# Altium footprint library CONNECTOR.PcbLib: 59 footprints (part 2 of 4)
Each footprint in its own frame and in the unit in brackets; x right, y up, seen from the top. Pads: shape width x height; smd on the part's side, far side on the other; paste and mask are expansions set on the pad; w line width, h text height; cw(c..) or ccw(c..) is an arc to the next point about the centre after c.
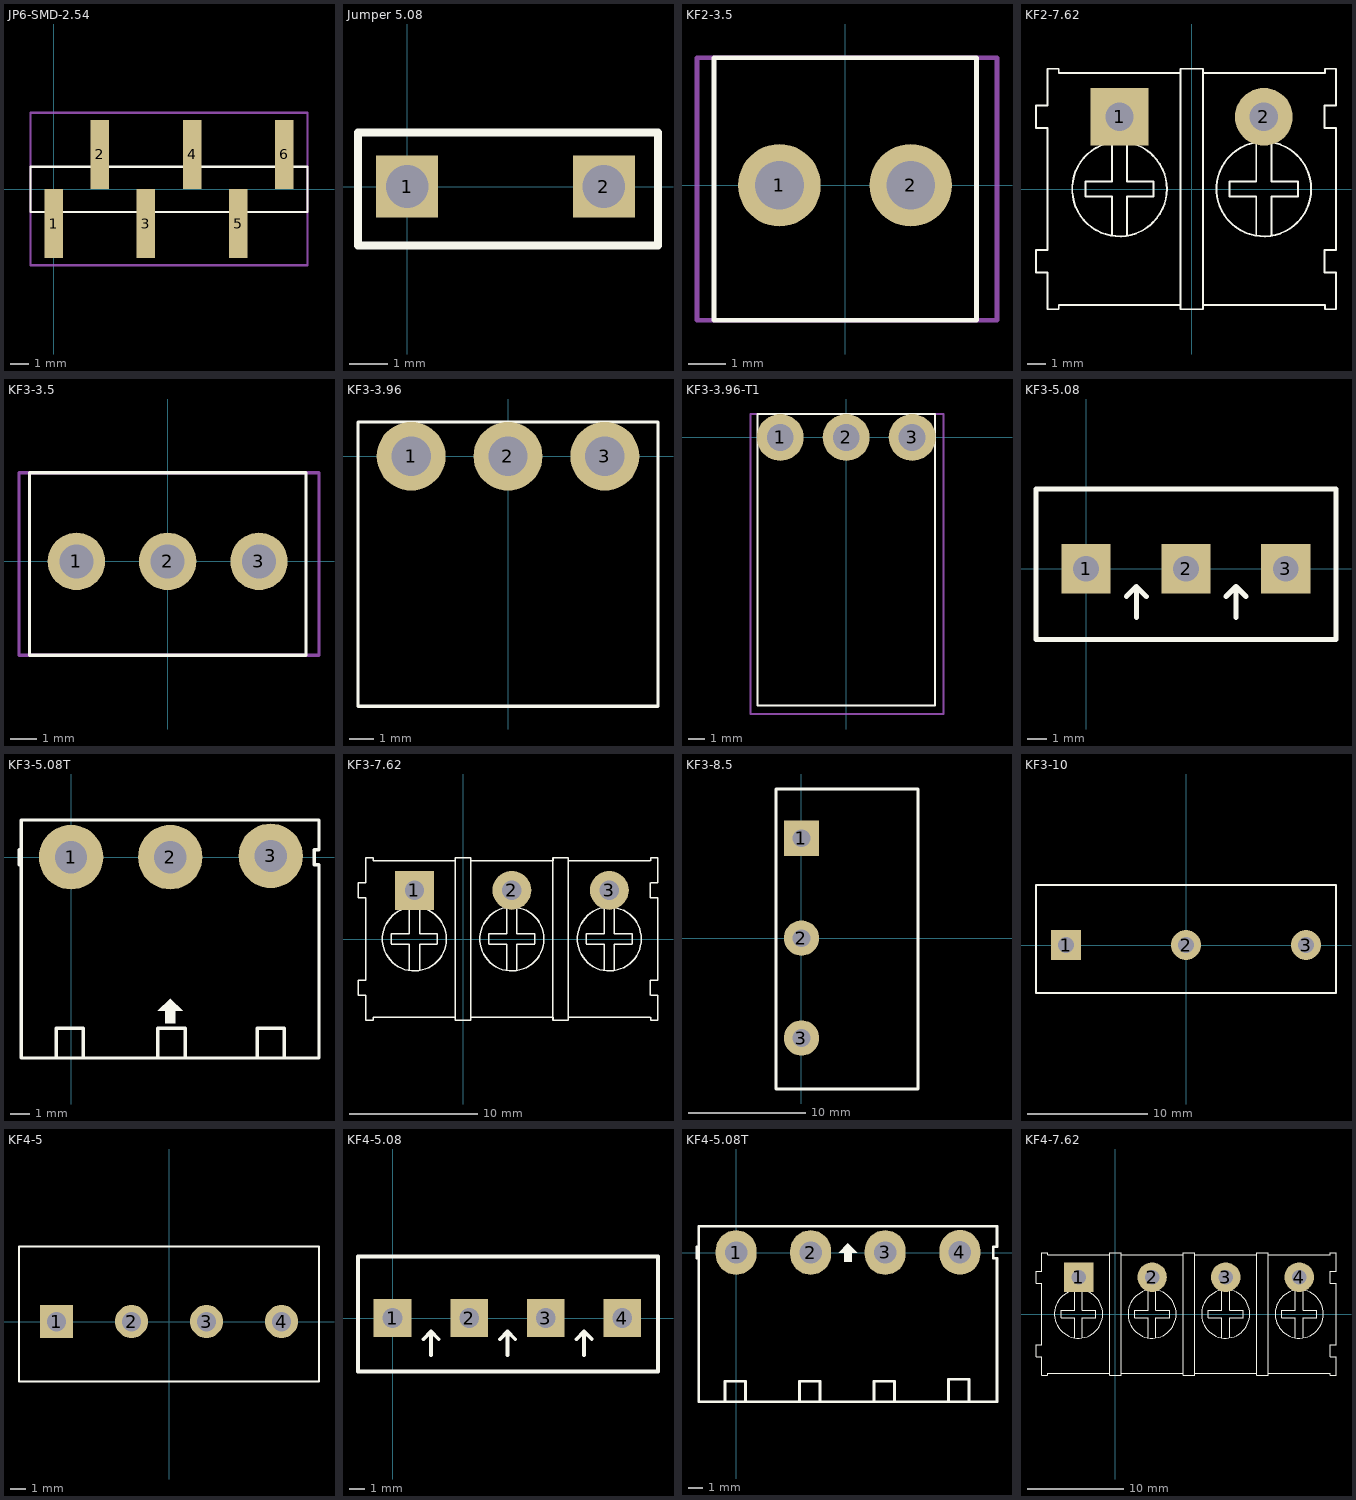
[diagram p1: the footprints below, top view; thin cyan lines are the x and y axes]

## JP6-SMD-2.54 [mm]
pads (6):
  rect 1.02x3.8 smd: 1(0,-1.9) 2(2.54,1.9) 3(5.08,-1.9) 4(7.62,1.9) 5(10.16,-1.9) 6(12.7,1.9)
Top Overlay:
  lines w0.127: -1.27,-1.27 -1.27,1.23 13.97,1.23 13.97,-1.27 -1.27,-1.27
Mechanical 1:
  lines w0.127: -1.27,-4.191 13.97,-4.191 13.97,4.191 -1.27,4.191 -1.27,-4.191
3D body "jp6.STEP": height 10.3, standoff -0.02, extent -1.27,-4.25 13.97,4.25

## Jumper 5.08 [mm]
pads (2):
  rect 1.6x1.6 hole 1.1: 1(0,0) 2(5.08,0)
Top Overlay:
  lines w0.203: -1.27,-1.524 0.921,-1.524 4.286,-1.524 6.477,-1.524 6.477,-0.794 6.477,0.667 6.477,1.397 4.54,1.397 0.667,1.397 -1.27,1.397 -1.27,-1.524
3D body "61300111121.stp": height 8.54, standoff -3, extent 3.81,-1.27 6.35,1.27
3D body "61300111121.stp": height 8.54, standoff -3, extent -1.27,-1.27 1.27,1.27

## KF2-3.5 [mm] "3,50mm - modular - blue - Horizontal wire entry - Pressure clamp - 8,4mm height - 02p"
height 8.4
pads (2):
  round 2.2 hole 1.3: 1(-1.75,0) 2(1.75,0)
Top Overlay:
  lines w0.127: -3.5,-3.6 3.5,-3.6 3.5,3.4 -3.5,3.4 -3.5,-3.6
Mechanical 13:
  lines w0.127: -3.95,-3.6 -3.95,3.4 4.05,3.4 4.05,-3.6 -3.95,-3.6
3D body "691103110002.stp": height 8.41, standoff -3.79, extent -3.95,-3.6 4.05,3.4

## KF2-7.62 [mil]
pads (2):
  rect 120x120 hole 59.06 unplated: 1(-150,150)
  round 120 hole 59.06 unplated: 2(150,150)
Top Overlay:
  circle w4: c150,0 r98.43
  circle w4: c-150,0 r98.43
  lines w4: -323.62,-173.62 -323.62,-126.38 -300,-126.38 -300,126.38 -323.62,126.38 -323.62,173.62 ; -323,-173.62 -300,-173.62 -300,-250 -277,-250 ; -323,173.62 -300,173.62 -300,250 -277,250 ; -276.38,-250 -276.38,-241 -23.62,-241 -23.62,-250 23.62,-250 23.62,-241 276.38,-241 ; -276.38,250 -276.38,241 -23.62,241 -23.62,250 23.62,250 23.62,241 276.38,241 ; -221,-15.75 -165.75,-15.75 ; -221,-15 -221,16 ; -221,15.75 -165.75,15.75 ; -165.75,-97 -165.75,-16 ; -165.75,16 -165.75,97 ; -134.25,-97 -134.25,-16 ; -134.25,-15.75 -79,-15.75 ; -134.25,15.75 -79,15.75 ; -134.25,16 -134.25,97 ; -79,-15 -79,16 ; -23.62,-244 -23.62,245 ; 23.62,-244 23.62,245 ; 79,-15.75 134.25,-15.75 ; 79,-15 79,16 ; 79,15.75 134.25,15.75 ; 134.25,-97 134.25,-16 ; 134.25,16 134.25,97 ; 165.75,-97 165.75,-16 ; 165.75,-15.75 221,-15.75 ; 165.75,15.75 221,15.75 ; 165.75,16 165.75,97 ; 221,-15 221,16 ; 276.38,-173.62 276.38,-126.38 300,-126.38 300,126.38 276.38,126.38 276.38,173.62 ; 277,-241 277,-250 300,-250 300,-173.62 277,-173.62 ; 277,173.62 300,173.62 300,250 277,250 277,241
3D body "691313410002.stp": height 336.61, standoff -155.51, extent -300,-241.22 300,231.22

## KF3-3.5 [mm] "3,50mm - modular - blue - Horizontal wire entry - Pressure clamp - 8,4mm height - 03p"
height 8.4
pads (3):
  round 2.2 hole 1.3: 1(-3.5,0) 2(0,0) 3(3.5,0)
Top Overlay:
  lines w0.127: -5.3,-3.6 5.3,-3.6 5.3,3.4 -5.3,3.4 -5.3,-3.6
Mechanical 13:
  lines w0.127: -5.7,-3.6 5.8,-3.6 5.8,3.4 -5.7,3.4 -5.7,-3.6
3D body "691103110003.stp": height 8.41, standoff -3.79, extent -5.7,-3.6 5.8,3.4

## KF3-3.96 [mm] "3,96mm - modular - green - Horizontal wire entry - Pressure clamp - 10mm height - 03p"
height 10
pads (3):
  round 2.8 hole 1.6: 1(-3.937,0) 2(0,0) 3(3.937,0)
Top Overlay:
  lines w0.127: -6.096,-10.16 -6.096,1.397 6.096,1.397 6.096,-10.16 -6.096,-10.16
3D body "HT396 3.96 Connector Green v1.step": height 7.36, standoff -4.04, extent -5.94,-9.979 5.94,0.508

## KF3-3.96-T1 [mm] "3,96mm - modular - blue - Horizontal wire entry - Pressure clamp - 10mm height - 03p"
height 10
pads (3):
  round 2.8 hole 1.6: 1(-3.937,0) 2(0,0) 3(3.937,0)
Top Overlay:
  lines w0.127: -5.3,-16.002 -5.3,1.397 5.3,1.397 5.3,-16.002 -5.3,-16.002
Mechanical 13:
  lines w0.127: -5.7,-16.51 -5.7,1.397 5.8,1.397 5.8,-16.51 -5.7,-16.51

## KF3-5.08 [mm]
pads (3):
  rect 2.5x2.5 hole 1.3: 1(0,0) 2(5.08,0) 3(10.147,0)
Top Overlay:
  lines w0.254: 2.045,-1.41 2.553,-0.902 ; 2.553,-2.464 2.553,-0.902 ; 3.061,-1.41 2.553,-0.902 ; 7.112,-1.41 7.62,-0.902 ; 7.62,-2.464 7.62,-0.902 ; 8.128,-1.41 7.62,-0.902 ; -2.54,-3.581 -2.54,4.064 12.7,4.064 12.7,-3.581 -2.54,-3.581
3D body "SW3DPS-HDR1x3-MED-GREEN.STEP": height 10, standoff -4, extent -2.42,-3.505 12.58,3.995

## KF3-5.08T [mil] "Header 3, 3 pin, hight 300mil, Pin to Pin 200, Colour Green"
height 300
pads (3):
  round 130 hole 65: 1(0,0) 2(200,0) 3(402.62,2.62)
Top Overlay:
  region: 200,-285 175,-310 190,-310 190,-335 210,-335 210,-310 225,-310
  lines w7: -105,-15 -105,15 ; -30,-400 -30,-345 25,-345 25,-400 ; 175,-400 175,-345 230,-345 230,-400 ; 375,-400 375,-345 430,-345 430,-400 ; -100,-405 500,-405 500,-15 490,-15 490,15 500,15 500,75 -100,75 -100,-405
3D body "User Library-BigHeader 5EHDR_1P.step": height 124.02, standoff -366.97, extent -95,-404 101.85,68.44
3D body "User Library-BigHeader 5EHDR_1P.step": height 124.02, standoff -366.97, extent 102,-404 298.85,68.44
3D body "User Library-BigHeader 5EHDR_1P.step": height 124.02, standoff -366.97, extent 299,-404.22 495.85,68.22

## KF3-7.62 [mil]
pads (3):
  rect 120x120 hole 59.06 unplated: 1(-150,150)
  round 120 hole 59.06 unplated: 2(150,150) 3(450,150)
Top Overlay:
  circle w4: c450,0 r98.43
  circle w4: c-150,0 r98.43
  circle w4: c150,0 r98.43
  lines w4: -323.62,-173.62 -323.62,-126.38 -300,-126.38 -300,126.38 -323.62,126.38 -323.62,173.62 ; -323,-173.62 -300,-173.62 -300,-250 -277,-250 ; -323,173.62 -300,173.62 -300,250 -277,250 ; -276.38,-250 -276.38,-241 -23.62,-241 -23.62,-250 23.62,-250 23.62,-241 276.38,-241 276.38,-250 323.62,-250 323.62,-241 576.38,-241 ; -276.38,250 -276.38,241 -23.62,241 -23.62,250 23.62,250 23.62,241 276.38,241 276.38,250 323.62,250 323.62,241 576.38,241 ; -221,-15.75 -165.75,-15.75 ; -221,-15 -221,16 ; -221,15.75 -165.75,15.75 ; -165.75,-97 -165.75,-16 ; -165.75,16 -165.75,97 ; -134.25,-97 -134.25,-16 ; -134.25,-15.75 -79,-15.75 ; -134.25,15.75 -79,15.75 ; -134.25,16 -134.25,97 ; -79,-15 -79,16 ; -23.62,-244 -23.62,245 ; 23.62,-244 23.62,245 ; 79,-15.75 134.25,-15.75 ; 79,-15 79,16 ; 79,15.75 134.25,15.75 ; 134.25,-97 134.25,-16 ; 134.25,16 134.25,97 ; 165.75,-97 165.75,-16 ; 165.75,-15.75 221,-15.75 ; 165.75,15.75 221,15.75 ; 165.75,16 165.75,97 ; 221,-15 221,16 ; 276.38,-244 276.38,245 ; 276.38,-173.62 276.38,-126.38 ; 276.38,126.38 276.38,173.62 ; 277,-241 277,-250 300,-250 ; 277,241 277,250 300,250 ; 323.62,-244 323.62,245 ; 379,-15.75 434.25,-15.75 ; 379,-15 379,16 ; 379,15.75 434.25,15.75 ; 434.25,-97 434.25,-16 ; 434.25,16 434.25,97 ; 465.75,-97 465.75,-16 ; 465.75,-15.75 521,-15.75 ; 465.75,15.75 521,15.75 ; 465.75,16 465.75,97 ; 521,-15 521,16 ; 576.38,-173.62 576.38,-126.38 600,-126.38 600,126.38 576.38,126.38 576.38,173.62 ; 577,-241 577,-250 600,-250 600,-173.62 577,-173.62 ; 577,173.62 600,173.62 600,250 577,250 577,241
3D body "691313410003.stp": height 336.61, standoff -155.51, extent -300.01,-241.23 599.99,231.22

## KF3-8.5 [mm]
pads (3):
  rect 3x3 hole 1.5: 1(0,8.509)
  round 3 hole 1.5: 2(0,0.009) 3(0,-8.491)
Top Overlay:
  lines w0.254: -2.159,-12.827 -2.159,12.7 9.906,12.7 9.906,-12.827 -2.159,-12.827
3D body "User Library-KF8500-3P.STEP": height 12.5, standoff -3.75, extent -2.159,-12.75 9.841,12.75

## KF3-10 [mm] "Serie 1368 - 10.00 mm _ 3 pins"
height 13
pads (3):
  rect 2.5x2.5 hole 1.3: 1(-10,0)
  round 2.5 hole 1.3: 2(0,0) 3(10,0)
Top Overlay:
  lines w0.2: -12.5,-4 12.5,-4 12.5,5 -12.5,5 -12.5,-4
3D body "691136810003.stp": height 13.1, standoff -3.9, extent -12.5,-4 12.5,5

## KF4-5 [mm] "Serie 1337 - 5.00 mm_4 pins"
height 13
pads (4):
  rect 2.2x2.2 hole 1.3: 1(-7.5,0)
  round 2.2 hole 1.3: 2(-2.5,0) 3(2.5,0) 4(7.5,0)
Top Overlay:
  lines w0.127: -10,-4 -10,5 10,5 10,-4 -10,-4
3D body "691133710004.stp": height 13, standoff -3.6, extent -10,-4 10,5

## KF4-5.08 [mm]
pads (4):
  rect 2.5x2.5 hole 1.3: 1(0,0) 2(5.08,0) 3(10.147,0) 4(15.215,0)
Top Overlay:
  lines w0.254: 2.045,-1.41 2.553,-0.902 ; 2.553,-2.464 2.553,-0.902 ; 3.061,-1.41 2.553,-0.902 ; 7.112,-1.41 7.62,-0.902 ; 7.62,-2.464 7.62,-0.902 ; 8.128,-1.41 7.62,-0.902 ; 12.179,-1.41 12.687,-0.902 ; 12.687,-2.464 12.687,-0.902 ; 13.195,-1.41 12.687,-0.902 ; -2.286,-3.531 17.577,-3.531 17.577,4.064 -2.286,4.064 -2.286,-3.531
3D body "SW3DPS-HDR1x4-MED-GREEN.STEP": height 10, standoff -4, extent -2.362,-3.429 17.638,4.071

## KF4-5.08T [mil] "Header 4, 4 pin, hight 300mil, Pin to Pin 200, Colour Green"
height 300
pads (4):
  oval 110x120 hole 60: 1(0,0) 2(200,0) 3(400.06,0.06) 4(600.39,0.39)
Top Overlay:
  region: 300,25 275,0 290,0 290,-25 310,-25 310,0 325,0
  lines w7: -105,-15 -105,15 ; -30,-400 -30,-345 25,-345 25,-400 ; 170,-400 170,-345 225,-345 225,-400 ; 370,-400 370,-345 425,-345 425,-400 ; 570,-395 570,-340 625,-340 625,-395 ; -100,-400 -100,70 700,70 700,15 690,15 690,-15 700,-15 700,-400 -100,-400
3D body "User Library-BigHeader 5EHDR_1P.step": height 334.11, standoff -156.88, extent -86.85,-406.22 110,66.22
3D body "User Library-BigHeader 5EHDR_1P.step": height 334.11, standoff -156.88, extent 300,-406.22 496.85,66.22
3D body "User Library-BigHeader 5EHDR_1P.step": height 334.11, standoff -156.88, extent 493.15,-406.22 690,66.22
3D body "User Library-BigHeader 5EHDR_1P.step": height 334.11, standoff -156.88, extent 110,-406.22 306.85,66.22

## KF4-7.62 [mil]
pads (4):
  rect 120x120 hole 59.06 unplated: 1(-150,150)
  round 120 hole 59.06 unplated: 2(150,150) 3(450,150) 4(750,150)
Top Overlay:
  circle w4: c150,0 r98.43
  circle w4: c-150,0 r98.43
  circle w4: c450,0 r98.43
  circle w4: c750,0 r98.43
  lines w4: -323.62,-173.62 -323.62,-126.38 -300,-126.38 -300,126.38 -323.62,126.38 -323.62,173.62 ; -323,-173.62 -300,-173.62 -300,-250 -277,-250 ; -323,173.62 -300,173.62 -300,250 -277,250 ; -276.38,-250 -276.38,-241 -23.62,-241 -23.62,-250 23.62,-250 23.62,-241 276.38,-241 276.38,-250 323.62,-250 323.62,-241 576.38,-241 576.38,-250 623.62,-250 623.62,-241 876.38,-241 ; -276.38,250 -276.38,241 -23.62,241 -23.62,250 23.62,250 23.62,241 276.38,241 276.38,250 323.62,250 323.62,241 576.38,241 576.38,250 623.62,250 623.62,241 876.38,241 ; -221,-15.75 -165.75,-15.75 ; -221,-15 -221,16 ; -221,15.75 -165.75,15.75 ; -165.75,-97 -165.75,-16 ; -165.75,16 -165.75,97 ; -134.25,-97 -134.25,-16 ; -134.25,-15.75 -79,-15.75 ; -134.25,15.75 -79,15.75 ; -134.25,16 -134.25,97 ; -79,-15 -79,16 ; -23.62,-244 -23.62,245 ; 23.62,-244 23.62,245 ; 79,-15.75 134.25,-15.75 ; 79,-15 79,16 ; 79,15.75 134.25,15.75 ; 134.25,-97 134.25,-16 ; 134.25,16 134.25,97 ; 165.75,-97 165.75,-16 ; 165.75,-15.75 221,-15.75 ; 165.75,15.75 221,15.75 ; 165.75,16 165.75,97 ; 221,-15 221,16 ; 276.38,-244 276.38,245 ; 276.38,-173.62 276.38,-126.38 ; 276.38,126.38 276.38,173.62 ; 277,-241 277,-250 300,-250 ; 277,241 277,250 300,250 ; 323.62,-244 323.62,245 ; 379,-15.75 434.25,-15.75 ; 379,-15 379,16 ; 379,15.75 434.25,15.75 ; 434.25,-97 434.25,-16 ; 434.25,16 434.25,97 ; 465.75,-97 465.75,-16 ; 465.75,-15.75 521,-15.75 ; 465.75,15.75 521,15.75 ; 465.75,16 465.75,97 ; 521,-15 521,16 ; 576.38,-244 576.38,245 ; 623.62,-244 623.62,245 ; 679,-15.75 734.25,-15.75 ; 679,-15 679,16 ; 679,15.75 734.25,15.75 ; 734.25,-97 734.25,-16 ; 734.25,16 734.25,97 ; 765.75,-97 765.75,-16 ; 765.75,-15.75 821,-15.75 ; 765.75,15.75 821,15.75 ; 765.75,16 765.75,97 ; 821,-15 821,16 ; 876.38,-173.62 876.38,-126.38 900,-126.38 900,126.38 876.38,126.38 876.38,173.62 ; 877,-241 877,-250 900,-250 900,-173.62 877,-173.62 ; 877,173.62 900,173.62 900,250 877,250 877,241 ; 577,-250 577,-241 577,-250 ; 577,-250 600,-250 577,-250 ; 577,250 600,250 577,250 ; 577,250 577,241 577,250 ; 576.38,-173.62 576.38,-126.38 576.38,-173.62 ; 576.38,126.38 576.38,173.62 576.38,126.38
3D body "691313410004.stp": height 336.61, standoff -155.51, extent -300,-246.22 900,226.22